# Altium schematic symbol library Maxim Sensors.SchLib: 1171 symbols (part 25 of 44) (continued)
## MAX6658MSA+ (continued)

## MAX6658MSA+T
designator U?
+ / -1 degC, SMBus-Compatible Remote / Local Temperature Sensor with Overtemperature Alarm, 11 Bits Temperature Resolution, -55 to 125 degC, 8-Pin SOIC (S8+5), Pb-Free, Tape and Reel; Generic Part Number: MAX6658; PartNumber: MAX6658MSA+T; Alarm Output: Alert, Overt; Functions: Remote & Local Sensor; Interface: 2-Wire/I2C/SMBus; Multi Droppable: Yes; Parasite Pwr.: No; DatasheetVersion: Rev. 5; PackageVersion: Rev. D, 10/2012; PackageReference: S8+5; PackageDescription: 8-Pin Small-Outline IC, Narrow (0.15in) (S8+5), Body 4.90 x 3.90 mm, Pitch 1.27 mm; Supplier 1: Digi-Key; Supplier Part Number 1: MAX6658MSA+T-ND; Supplier 2: Mouser; Supplier Part Number 2: 700-MAX6658MSAT; Packing: Tape and Reel; Mounting Technology: Surface Mount; Code_JEDEC: MS012; ComponentLink1Description: Manufacturer URL; ComponentLink1URL: http://www.maximintegrated.com/; ComponentLink2Description: Datasheet; ComponentLink2URL: http://datasheets.maximintegrated.com/en/ds/MAX6657-MAX6659.pdf; ComponentLink3Description: Package Specification; ComponentLink3URL: http://pdfserv.maximintegrated.com/package_dwgs/21-0041.PDF
footprint MAXM-S8+5_N (SOIC, 8-Leads, Body 4.90x3.90mm, Pitch 1.27mm, IPC Medium Density)
footprint MAXM-S8+5_L (SOIC, 8-Leads, Body 4.90x3.90mm, Pitch 1.27mm, IPC High Density)
footprint MAXM-S8+5_M (SOIC, 8-Leads, Body 4.90x3.90mm, Pitch 1.27mm, IPC Low Density)
pins: 1 VCC (power) "Supply Voltage Input, +3V to +5.5V. Bypass to GND with a 0.1uF capacitor. A 200ohm series resistor is recommended but not required for additional noise filtering. See Typical Operating Circuit", 2 DXP "Combined Remote-Diode Current Source and A/D Positive Input for Remote-Diode Channel. DO NOT LEAVE DXP UNCONNECTED; connect DXP to DXN if no remote diode is used. Place a 2200pF capacitor between DXP and DXN for noise (See Datasheet)", 3 DXN "Combined Remote-Diode Current Sink and A/D Negative Input. DXN is internally biased to one diode drop above ground.", 4 ~{OVERT1} (oc) "Overtemperature Active-Low Output, Open-Drain. Output is logic low only when temperature is above the software programmed threshold.", 5 GND (power) "Ground", 6 ~{ALERT} (oc) "SMBus Alert (Interrupt) Active-Low Output, Open-Drain. Asserts when temperature exceeds user-set limits (high or low temperature). Stays asserted until acknowledged by either reading the Status register or by successfully (See Datasheet)", 7 SMBDATA (io) "SMBus Serial-Data Input/Output, Open-Drain", 8 SMBCLK (in) "SMBus Serial-Clock Input"

## MAX6658MSA-T
designator U?
+ / -1 degC, SMBus-Compatible Remote / Local Temperature Sensor with Overtemperature Alarm, 11 Bits Temperature Resolution, -55 to 125 degC, 8-Pin SOIC (S8-5), Tape and Reel; Generic Part Number: MAX6658; PartNumber: MAX6658MSA-T; Alarm Output: Alert, Overt; Functions: Remote & Local Sensor; Interface: 2-Wire/I2C/SMBus; Multi Droppable: Yes; Parasite Pwr.: No; DatasheetVersion: Rev. 5; PackageVersion: Rev. D, 10/2012; PackageReference: S8-5; PackageDescription: 8-Pin Small-Outline IC, Narrow (0.15in) (S8-5), Body 4.90 x 3.90 mm, Pitch 1.27 mm; Supplier 1: Mouser; Supplier Part Number 1: N/A; Packing: Tape and Reel; Mounting Technology: Surface Mount; Code_JEDEC: MS012; ComponentLink1Description: Manufacturer URL; ComponentLink1URL: http://www.maximintegrated.com/; ComponentLink2Description: Datasheet; ComponentLink2URL: http://datasheets.maximintegrated.com/en/ds/MAX6657-MAX6659.pdf; ComponentLink3Description: Package Specification; ComponentLink3URL: http://pdfserv.maximintegrated.com/package_dwgs/21-0041.PDF
footprint MAXM-S8-5_N (SOIC, 8-Leads, Body 4.9x3.9mm, Pitch 1.27mm, IPC Medium Density)
footprint MAXM-S8-5_L (SOIC, 8-Leads, Body 4.9x3.9mm, Pitch 1.27mm, IPC High Density)
footprint MAXM-S8-5_M (SOIC, 8-Leads, Body 4.9x3.9mm, Pitch 1.27mm, IPC Low Density)
pins: 1 VCC (power) "Supply Voltage Input, +3V to +5.5V. Bypass to GND with a 0.1uF capacitor. A 200ohm series resistor is recommended but not required for additional noise filtering. See Typical Operating Circuit", 2 DXP "Combined Remote-Diode Current Source and A/D Positive Input for Remote-Diode Channel. DO NOT LEAVE DXP UNCONNECTED; connect DXP to DXN if no remote diode is used. Place a 2200pF capacitor between DXP and DXN for noise (See Datasheet)", 3 DXN "Combined Remote-Diode Current Sink and A/D Negative Input. DXN is internally biased to one diode drop above ground.", 4 ~{OVERT1} (oc) "Overtemperature Active-Low Output, Open-Drain. Output is logic low only when temperature is above the software programmed threshold.", 5 GND (power) "Ground", 6 ~{ALERT} (oc) "SMBus Alert (Interrupt) Active-Low Output, Open-Drain. Asserts when temperature exceeds user-set limits (high or low temperature). Stays asserted until acknowledged by either reading the Status register or by successfully (See Datasheet)", 7 SMBDATA (io) "SMBus Serial-Data Input/Output, Open-Drain", 8 SMBCLK (in) "SMBus Serial-Clock Input"

## MAX6659MEE
designator U?
+ / -1 degC, SMBus-Compatible Remote / Local Temperature Sensor with Overtemperature Alarm, 11 Bits Temperature Resolution, -55 to 125 degC, 16-Pin SOP (E16-5); Generic Part Number: MAX6659; PartNumber: MAX6659MEE; Alarm Output: Alert, Overt; Functions: Remote & Local Sensor; Interface: 2-Wire/I2C/SMBus; Multi Droppable: Yes; Parasite Pwr.: No; DatasheetVersion: Rev. 5; PackageVersion: Rev. K, 04/2012; PackageReference: E16-5; PackageDescription: 16-Pin Quarter Small-Outline Package, Body 3.9 x 4.89 mm, Pitch 0.635 mm; Supplier 1: Mouser; Supplier Part Number 1: N/A; Mounting Technology: Surface Mount; Code_JEDEC: MO-137; ComponentLink1Description: Manufacturer URL; ComponentLink1URL: http://www.maximintegrated.com/; ComponentLink2Description: Datasheet; ComponentLink2URL: http://datasheets.maximintegrated.com/en/ds/MAX6657-MAX6659.pdf; ComponentLink3Description: Package Specification; ComponentLink3URL: http://pdfserv.maximintegrated.com/package_dwgs/21-0055.PDF
footprint MAXM-E16-5_N (SOP, 16-Leads, Body 4.89x3.9mm, Pitch 0.635mm, IPC Medium Density)
footprint MAXM-E16-5_L (SOP, 16-Leads, Body 4.89x3.9mm, Pitch 0.635mm, IPC High Density)
footprint MAXM-E16-5_M (SOP, 16-Leads, Body 4.89x3.9mm, Pitch 0.635mm, IPC Low Density)
part A pins: 1 VCC (power) "Supply Voltage Input, +3V to +5.5V. Bypass to GND with a 0.1uF capacitor. A 200ohm series resistor is recommended but not required for additional noise filtering. See Typical Operating Circuit.", 3 DXP "Combined Remote-Diode Current Source and A/D Positive Input for Remote-Diode Channel. DO NOT LEAVE DXP UNCONNECTED; connect DXP to DXN if no remote diode is used. Place a 2200pF capacitor between DXP and DXN for noise (See Datasheet)", 4 DXN "Combined Remote-Diode Current Sink and A/D Negative Input. DXN is internally biased to one diode drop above ground.", 5 ADD (in) "SMBus Address-Select Pin. The MAX6659 is set to one of three available addresses (connect to VCC, GND, or leave open). See Slave Addresses section.", 6 ~{OVERT1} (oc) "Overtemperature Active-Low Output, Open-Drain. Output is logic low only when temperature is above the software programmed threshold.", 7 GND (power) "Ground", 8 GND (power) "Ground", 9 ~{ALERT} (oc) "SMBus Alert (Interrupt) Active-Low Output, Open-Drain. Asserts when temperature exceeds user-set limits (high or low temperature). Stays asserted until acknowledged by either reading the Status register or by successfully (See Datasheet)", 10 ~{OVERT2} (oc) "Overtemperature Active-Low Output, Open-Drain. Output is logic low only when temperature is above the software programmed threshold.", 12 SMBDATA (io) "SMBus Serial-Data Input/Output, Open-Drain", 14 SMBCLK (in) "SMBus Serial-Clock Input", 15 ~{STBY} (in) "Hardware Standby Input. Temperature and comparison threshold data are retained in standby mode. If S\T\B\Y\ is low, the IC is put into standby mode."
part B pins: 2 NC "Not internally connected. Do not make connections to these pins.", 11 NC "Not internally connected. Do not make connections to these pins.", 13 NC "Not internally connected. Do not make connections to these pins.", 16 NC "Not internally connected. Do not make connections to these pins."

## MAX6659MEE+
designator U?
+ / -1 degC, SMBus-Compatible Remote / Local Temperature Sensor with Overtemperature Alarm, 11 Bits Temperature Resolution, -55 to 125 degC, 16-Pin SOP (E16+5), Pb-Free,; Generic Part Number: MAX6659; PartNumber: MAX6659MEE+; Alarm Output: Alert, Overt; Functions: Remote & Local Sensor; Interface: 2-Wire/I2C/SMBus; Multi Droppable: Yes; Parasite Pwr.: No; DatasheetVersion: Rev. 5; PackageVersion: Rev. K, 04/2012; PackageReference: E16+5; PackageDescription: 16-Pin Quarter Small-Outline Package, Body 3.9 x 4.89 mm, Pitch 0.635 mm; Supplier 1: Digi-Key; Supplier Part Number 1: MAX6659MEE+-ND; Supplier 2: Mouser; Supplier Part Number 2: 700-MAX6659MEE; Mounting Technology: Surface Mount; Code_JEDEC: MO-137; ComponentLink1Description: Manufacturer URL; ComponentLink1URL: http://www.maximintegrated.com/; ComponentLink2Description: Datasheet; ComponentLink2URL: http://datasheets.maximintegrated.com/en/ds/MAX6657-MAX6659.pdf; ComponentLink3Description: Package Specification; ComponentLink3URL: http://pdfserv.maximintegrated.com/package_dwgs/21-0055.PDF
footprint MAXM-E16+5_N (SOP, 16-Leads, Body 4.89x3.9mm, Pitch 0.635mm, IPC Medium Density)
footprint MAXM-E16+5_L (SOP, 16-Leads, Body 4.89x3.9mm, Pitch 0.635mm, IPC High Density)
footprint MAXM-E16+5_M (SOP, 16-Leads, Body 4.89x3.9mm, Pitch 0.635mm, IPC Low Density)
part A pins: 1 VCC (power) "Supply Voltage Input, +3V to +5.5V. Bypass to GND with a 0.1uF capacitor. A 200ohm series resistor is recommended but not required for additional noise filtering. See Typical Operating Circuit.", 3 DXP "Combined Remote-Diode Current Source and A/D Positive Input for Remote-Diode Channel. DO NOT LEAVE DXP UNCONNECTED; connect DXP to DXN if no remote diode is used. Place a 2200pF capacitor between DXP and DXN for noise (See Datasheet)", 4 DXN "Combined Remote-Diode Current Sink and A/D Negative Input. DXN is internally biased to one diode drop above ground.", 5 ADD (in) "SMBus Address-Select Pin. The MAX6659 is set to one of three available addresses (connect to VCC, GND, or leave open). See Slave Addresses section.", 6 ~{OVERT1} (oc) "Overtemperature Active-Low Output, Open-Drain. Output is logic low only when temperature is above the software programmed threshold.", 7 GND (power) "Ground", 8 GND (power) "Ground", 9 ~{ALERT} (oc) "SMBus Alert (Interrupt) Active-Low Output, Open-Drain. Asserts when temperature exceeds user-set limits (high or low temperature). Stays asserted until acknowledged by either reading the Status register or by successfully (See Datasheet)", 10 ~{OVERT2} (oc) "Overtemperature Active-Low Output, Open-Drain. Output is logic low only when temperature is above the software programmed threshold.", 12 SMBDATA (io) "SMBus Serial-Data Input/Output, Open-Drain", 14 SMBCLK (in) "SMBus Serial-Clock Input", 15 ~{STBY} (in) "Hardware Standby Input. Temperature and comparison threshold data are retained in standby mode. If S\T\B\Y\ is low, the IC is put into standby mode."
part B pins: 2 NC "Not internally connected. Do not make connections to these pins.", 11 NC "Not internally connected. Do not make connections to these pins.", 13 NC "Not internally connected. Do not make connections to these pins.", 16 NC "Not internally connected. Do not make connections to these pins."

## MAX6659MEE+T
designator U?
+ / -1 degC, SMBus-Compatible Remote / Local Temperature Sensor with Overtemperature Alarm, 11 Bits Temperature Resolution, -55 to 125 degC, 16-Pin SOP (E16+5), Pb-Free, Tape and Reel; Generic Part Number: MAX6659; PartNumber: MAX6659MEE+T; Alarm Output: Alert, Overt; Functions: Remote & Local Sensor; Interface: 2-Wire/I2C/SMBus; Multi Droppable: Yes; Parasite Pwr.: No; DatasheetVersion: Rev. 5; PackageVersion: Rev. K, 04/2012; PackageReference: E16+5; PackageDescription: 16-Pin Quarter Small-Outline Package, Body 3.9 x 4.89 mm, Pitch 0.635 mm; Supplier 1: Digi-Key; Supplier Part Number 1: MAX6659MEE+T-ND; Supplier 2: Mouser; Supplier Part Number 2: 700-MAX6659MEET; Packing: Tape and Reel; Mounting Technology: Surface Mount; Code_JEDEC: MO-137; ComponentLink1Description: Manufacturer URL; ComponentLink1URL: http://www.maximintegrated.com/; ComponentLink2Description: Datasheet; ComponentLink2URL: http://datasheets.maximintegrated.com/en/ds/MAX6657-MAX6659.pdf; ComponentLink3Description: Package Specification; ComponentLink3URL: http://pdfserv.maximintegrated.com/package_dwgs/21-0055.PDF
footprint MAXM-E16+5_N (SOP, 16-Leads, Body 4.89x3.9mm, Pitch 0.635mm, IPC Medium Density)
footprint MAXM-E16+5_L (SOP, 16-Leads, Body 4.89x3.9mm, Pitch 0.635mm, IPC High Density)
footprint MAXM-E16+5_M (SOP, 16-Leads, Body 4.89x3.9mm, Pitch 0.635mm, IPC Low Density)
part A pins: 1 VCC (power) "Supply Voltage Input, +3V to +5.5V. Bypass to GND with a 0.1uF capacitor. A 200ohm series resistor is recommended but not required for additional noise filtering. See Typical Operating Circuit.", 3 DXP "Combined Remote-Diode Current Source and A/D Positive Input for Remote-Diode Channel. DO NOT LEAVE DXP UNCONNECTED; connect DXP to DXN if no remote diode is used. Place a 2200pF capacitor between DXP and DXN for noise (See Datasheet)", 4 DXN "Combined Remote-Diode Current Sink and A/D Negative Input. DXN is internally biased to one diode drop above ground.", 5 ADD (in) "SMBus Address-Select Pin. The MAX6659 is set to one of three available addresses (connect to VCC, GND, or leave open). See Slave Addresses section.", 6 ~{OVERT1} (oc) "Overtemperature Active-Low Output, Open-Drain. Output is logic low only when temperature is above the software programmed threshold.", 7 GND (power) "Ground", 8 GND (power) "Ground", 9 ~{ALERT} (oc) "SMBus Alert (Interrupt) Active-Low Output, Open-Drain. Asserts when temperature exceeds user-set limits (high or low temperature). Stays asserted until acknowledged by either reading the Status register or by successfully (See Datasheet)", 10 ~{OVERT2} (oc) "Overtemperature Active-Low Output, Open-Drain. Output is logic low only when temperature is above the software programmed threshold.", 12 SMBDATA (io) "SMBus Serial-Data Input/Output, Open-Drain", 14 SMBCLK (in) "SMBus Serial-Clock Input", 15 ~{STBY} (in) "Hardware Standby Input. Temperature and comparison threshold data are retained in standby mode. If S\T\B\Y\ is low, the IC is put into standby mode."
part B pins: 2 NC "Not internally connected. Do not make connections to these pins.", 11 NC "Not internally connected. Do not make connections to these pins.", 13 NC "Not internally connected. Do not make connections to these pins.", 16 NC "Not internally connected. Do not make connections to these pins."

## MAX6659MEE-T
designator U?
+ / -1 degC, SMBus-Compatible Remote / Local Temperature Sensor with Overtemperature Alarm, 11 Bits Temperature Resolution, -55 to 125 degC, 16-Pin SOP (E16-5), Tape and Reel; Generic Part Number: MAX6659; PartNumber: MAX6659MEE-T; Alarm Output: Alert, Overt; Functions: Remote & Local Sensor; Interface: 2-Wire/I2C/SMBus; Multi Droppable: Yes; Parasite Pwr.: No; DatasheetVersion: Rev. 5; PackageVersion: Rev. K, 04/2012; PackageReference: E16-5; PackageDescription: 16-Pin Quarter Small-Outline Package, Body 3.9 x 4.89 mm, Pitch 0.635 mm; Supplier 1: Mouser; Supplier Part Number 1: N/A; Packing: Tape and Reel; Mounting Technology: Surface Mount; Code_JEDEC: MO-137; ComponentLink1Description: Manufacturer URL; ComponentLink1URL: http://www.maximintegrated.com/; ComponentLink2Description: Datasheet; ComponentLink2URL: http://datasheets.maximintegrated.com/en/ds/MAX6657-MAX6659.pdf; ComponentLink3Description: Package Specification; ComponentLink3URL: http://pdfserv.maximintegrated.com/package_dwgs/21-0055.PDF
footprint MAXM-E16-5_N (SOP, 16-Leads, Body 4.89x3.9mm, Pitch 0.635mm, IPC Medium Density)
footprint MAXM-E16-5_L (SOP, 16-Leads, Body 4.89x3.9mm, Pitch 0.635mm, IPC High Density)
footprint MAXM-E16-5_M (SOP, 16-Leads, Body 4.89x3.9mm, Pitch 0.635mm, IPC Low Density)
part A pins: 1 VCC (power) "Supply Voltage Input, +3V to +5.5V. Bypass to GND with a 0.1uF capacitor. A 200ohm series resistor is recommended but not required for additional noise filtering. See Typical Operating Circuit.", 3 DXP "Combined Remote-Diode Current Source and A/D Positive Input for Remote-Diode Channel. DO NOT LEAVE DXP UNCONNECTED; connect DXP to DXN if no remote diode is used. Place a 2200pF capacitor between DXP and DXN for noise (See Datasheet)", 4 DXN "Combined Remote-Diode Current Sink and A/D Negative Input. DXN is internally biased to one diode drop above ground.", 5 ADD (in) "SMBus Address-Select Pin. The MAX6659 is set to one of three available addresses (connect to VCC, GND, or leave open). See Slave Addresses section.", 6 ~{OVERT1} (oc) "Overtemperature Active-Low Output, Open-Drain. Output is logic low only when temperature is above the software programmed threshold.", 7 GND (power) "Ground", 8 GND (power) "Ground", 9 ~{ALERT} (oc) "SMBus Alert (Interrupt) Active-Low Output, Open-Drain. Asserts when temperature exceeds user-set limits (high or low temperature). Stays asserted until acknowledged by either reading the Status register or by successfully (See Datasheet)", 10 ~{OVERT2} (oc) "Overtemperature Active-Low Output, Open-Drain. Output is logic low only when temperature is above the software programmed threshold.", 12 SMBDATA (io) "SMBus Serial-Data Input/Output, Open-Drain", 14 SMBCLK (in) "SMBus Serial-Clock Input", 15 ~{STBY} (in) "Hardware Standby Input. Temperature and comparison threshold data are retained in standby mode. If S\T\B\Y\ is low, the IC is put into standby mode."
part B pins: 2 NC "Not internally connected. Do not make connections to these pins.", 11 NC "Not internally connected. Do not make connections to these pins.", 13 NC "Not internally connected. Do not make connections to these pins.", 16 NC "Not internally connected. Do not make connections to these pins."

## MAX6660AEE
designator U?
Fan-Speed Regulator and Monitor with I2C / SMBus Interface, -40 to 125 degC, 16-Pin SOP (E16-5); Generic Part Number: MAX6660; PartNumber: MAX6660AEE; Fan Cntrl.: Linear; Interface: 2-Wire/I2C/SMBus; DatasheetVersion: Rev. 1; PackageVersion: Rev. K, 04/2012; PackageReference: E16-5; PackageDescription: 16-Pin Quarter Small-Outline Package, Body 3.9 x 4.89 mm, Pitch 0.635 mm; Supplier 1: Mouser; Supplier Part Number 1: N/A; Mounting Technology: Surface Mount; Code_JEDEC: MO-137; ComponentLink1Description: Manufacturer URL; ComponentLink1URL: http://www.maximintegrated.com/; ComponentLink2Description: Datasheet; ComponentLink2URL: http://datasheets.maximintegrated.com/en/ds/MAX6660.pdf; ComponentLink3Description: Package Specification; ComponentLink3URL: http://pdfserv.maximintegrated.com/package_dwgs/21-0055.PDF
footprint MAXM-E16-5_N (SOP, 16-Leads, Body 4.89x3.9mm, Pitch 0.635mm, IPC Medium Density)
footprint MAXM-E16-5_L (SOP, 16-Leads, Body 4.89x3.9mm, Pitch 0.635mm, IPC High Density)
footprint MAXM-E16-5_M (SOP, 16-Leads, Body 4.89x3.9mm, Pitch 0.635mm, IPC Low Density)
pins: 1 VFAN (power) "Fan Drive Power-Supply Input. 4.5V to 13.5V.", 2 VCC (power) "Supply Voltage Input. +3V to +5.5V. Bypass VCC to ground with a 0.1uF capacitor.", 3 DXP "Input: Remote-Junction Anode. Place a 2200pF capacitor between DXP and DXN for noise filtering.", 4 DXN "Input: Remote-Junction Cathode. DXN is internally biased to a diode voltage above ground.", 5 FAN (oc) "Open-Drain Output to Fan Low Side. Connect a minimum 1uF capacitor between FAN and VFAN.", 6 ADD1 (in) "SMBus Address Select Pin. ADD0 and ADD1 are sampled upon power-up.", 7 PGND (power) "Power Ground", 8 AGND (power) "Analog Ground", 9 ~{OVERT} (oc) "Overtemperature Shutdown Output. Active-low output (programmable for active high if desired). Open drain.", 10 ADD0 (in) "SMBus Slave Address Select Pin. ADD0 and ADD1 are sampled upon power-up.", 11 ~{ALERT} (oc) "SMBus Alert (Interrupt) Output. Open-drain, active-low output.", 12 SMBDATA (io) "SMBus Serial Data Input/Output. Open drain.", 13 GAIN (in) "Gain Control. Connect an external resistor from GAIN to VCC to reduce the gain of the current-sense mode.", 14 SMBCLK (in) "SMBus Clock Line from Controller. This line tolerates inputs up to VCC even if MAX6660 is not powered.", 15 ~{STBY} (in) "Hardware Standby Input. Drive S\T\B\Y\ low to reduce supply current. Temperature and comparison data are retained in standby mode.", 16 TACH IN (in) "Fan Tachometer Input. Tolerates voltages up to VFAN."

## MAX6660AEE+
designator U?
Fan-Speed Regulator and Monitor with I2C / SMBus Interface, -40 to 125 degC, 16-Pin SOP (E16+5), Pb-Free; Generic Part Number: MAX6660; PartNumber: MAX6660AEE+; Fan Cntrl.: Linear; Interface: 2-Wire/I2C/SMBus; DatasheetVersion: Rev. 1; PackageVersion: Rev. K, 04/2012; PackageReference: E16+5; PackageDescription: 16-Pin Quarter Small-Outline Package, Body 3.9 x 4.89 mm, Pitch 0.635 mm; Supplier 1: Digi-Key; Supplier Part Number 1: MAX6660AEE+-ND; Supplier 2: Mouser; Supplier Part Number 2: 700-MAX6660AEE; Mounting Technology: Surface Mount; Code_JEDEC: MO-137; ComponentLink1Description: Manufacturer URL; ComponentLink1URL: http://www.maximintegrated.com/; ComponentLink2Description: Datasheet; ComponentLink2URL: http://datasheets.maximintegrated.com/en/ds/MAX6660.pdf; ComponentLink3Description: Package Specification; ComponentLink3URL: http://pdfserv.maximintegrated.com/package_dwgs/21-0055.PDF
footprint MAXM-E16+5_N (SOP, 16-Leads, Body 4.89x3.9mm, Pitch 0.635mm, IPC Medium Density)
footprint MAXM-E16+5_L (SOP, 16-Leads, Body 4.89x3.9mm, Pitch 0.635mm, IPC High Density)
footprint MAXM-E16+5_M (SOP, 16-Leads, Body 4.89x3.9mm, Pitch 0.635mm, IPC Low Density)
pins: 1 VFAN (power) "Fan Drive Power-Supply Input. 4.5V to 13.5V.", 2 VCC (power) "Supply Voltage Input. +3V to +5.5V. Bypass VCC to ground with a 0.1uF capacitor.", 3 DXP "Input: Remote-Junction Anode. Place a 2200pF capacitor between DXP and DXN for noise filtering.", 4 DXN "Input: Remote-Junction Cathode. DXN is internally biased to a diode voltage above ground.", 5 FAN (oc) "Open-Drain Output to Fan Low Side. Connect a minimum 1uF capacitor between FAN and VFAN.", 6 ADD1 (in) "SMBus Address Select Pin. ADD0 and ADD1 are sampled upon power-up.", 7 PGND (power) "Power Ground", 8 AGND (power) "Analog Ground", 9 ~{OVERT} (oc) "Overtemperature Shutdown Output. Active-low output (programmable for active high if desired). Open drain.", 10 ADD0 (in) "SMBus Slave Address Select Pin. ADD0 and ADD1 are sampled upon power-up.", 11 ~{ALERT} (oc) "SMBus Alert (Interrupt) Output. Open-drain, active-low output.", 12 SMBDATA (io) "SMBus Serial Data Input/Output. Open drain.", 13 GAIN (in) "Gain Control. Connect an external resistor from GAIN to VCC to reduce the gain of the current-sense mode.", 14 SMBCLK (in) "SMBus Clock Line from Controller. This line tolerates inputs up to VCC even if MAX6660 is not powered.", 15 ~{STBY} (in) "Hardware Standby Input. Drive S\T\B\Y\ low to reduce supply current. Temperature and comparison data are retained in standby mode.", 16 TACH IN (in) "Fan Tachometer Input. Tolerates voltages up to VFAN."

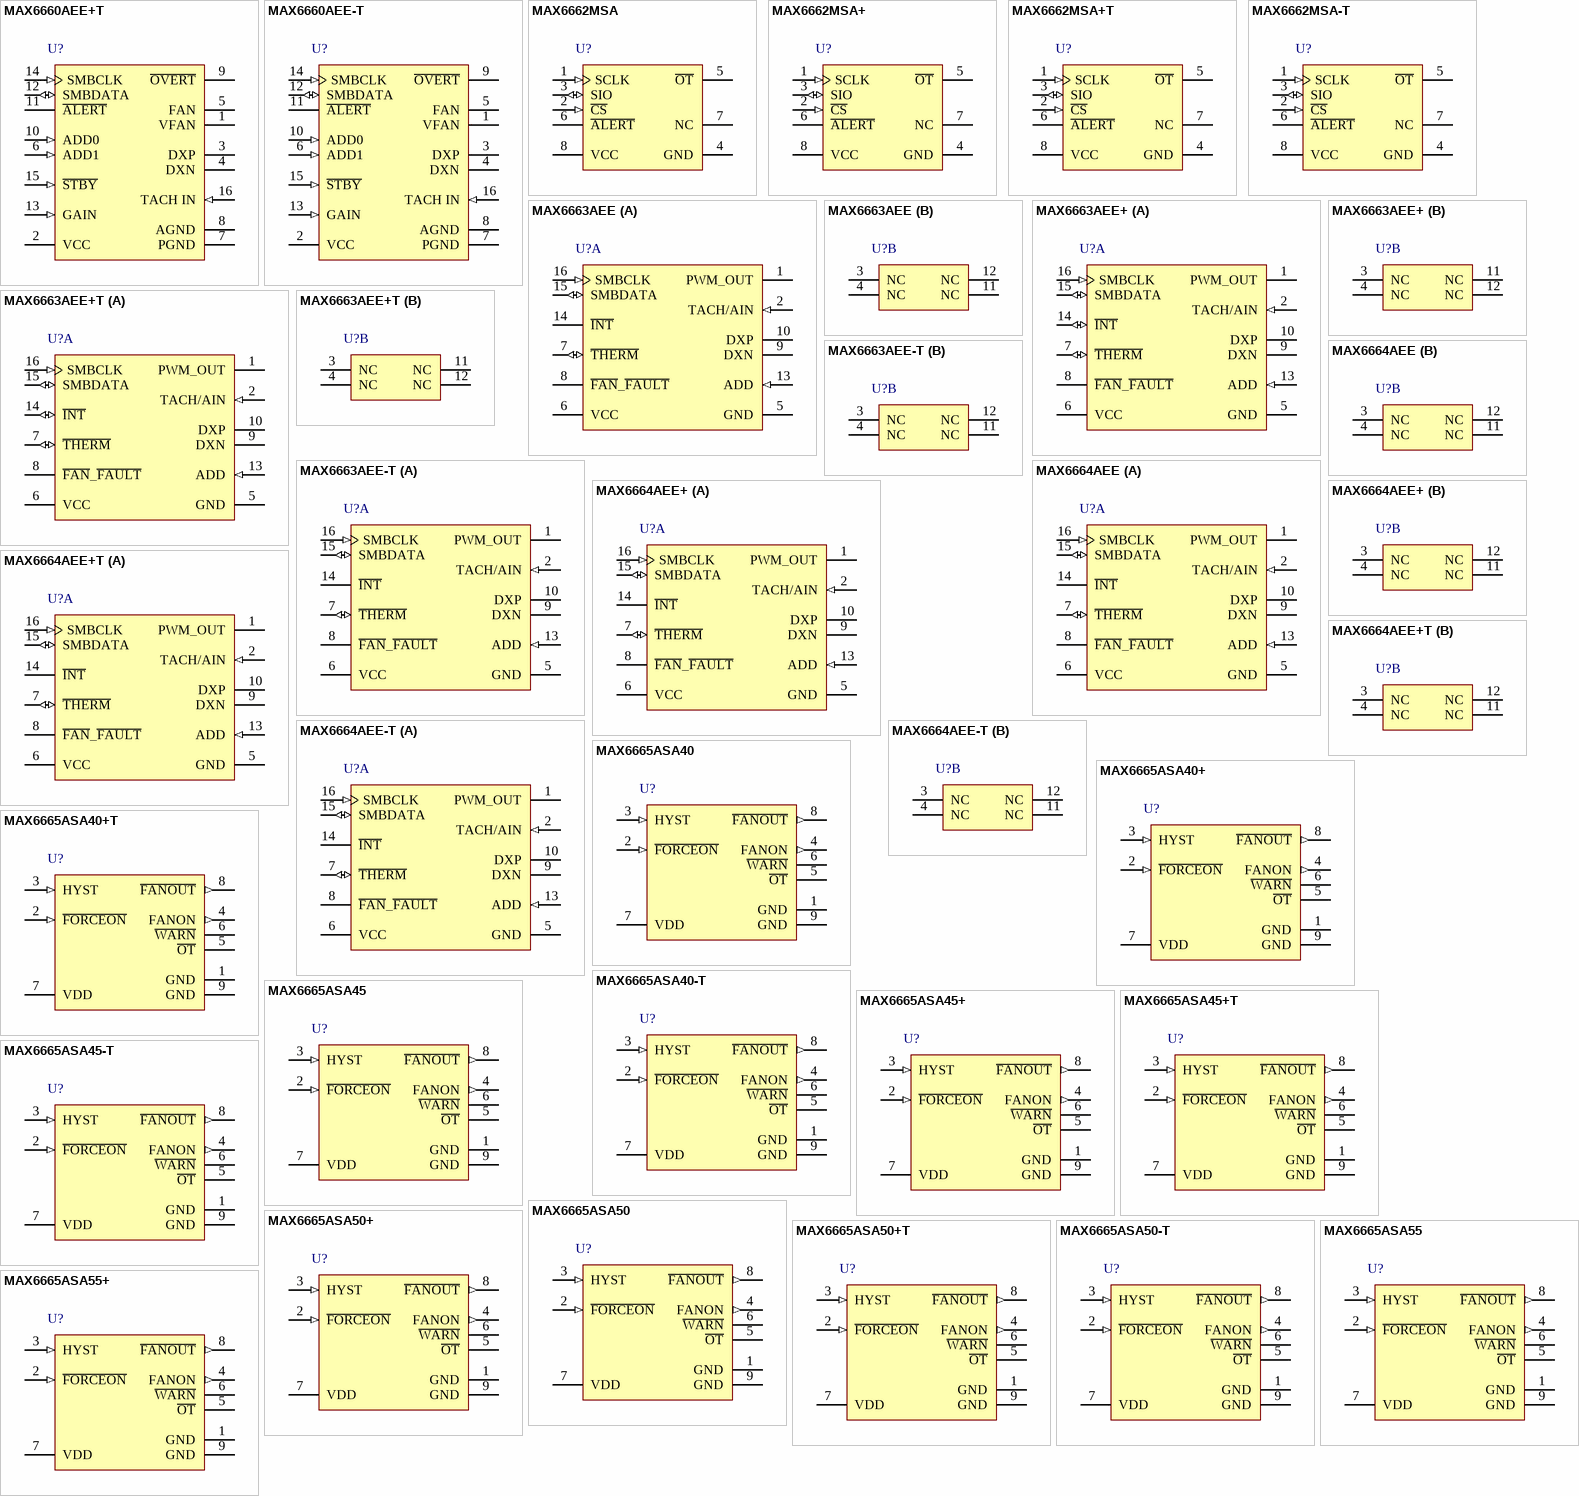
[diagram p21: symbols MAX6660AEE+T to MAX6665ASA55+]

## MAX6660AEE+T
designator U?
Fan-Speed Regulator and Monitor with I2C / SMBus Interface, -40 to 125 degC, 16-Pin SOP (E16+5), Pb-Free, Tape and Reel; Generic Part Number: MAX6660; PartNumber: MAX6660AEE+T; Fan Cntrl.: Linear; Interface: 2-Wire/I2C/SMBus; DatasheetVersion: Rev. 1; PackageVersion: Rev. K, 04/2012; PackageReference: E16+5; PackageDescription: 16-Pin Quarter Small-Outline Package, Body 3.9 x 4.89 mm, Pitch 0.635 mm; Supplier 1: Digi-Key; Supplier Part Number 1: MAX6660AEE+T-ND; Supplier 2: Mouser; Supplier Part Number 2: 700-MAX6660AEET; Packing: Tape and Reel; Mounting Technology: Surface Mount; Code_JEDEC: MO-137; ComponentLink1Description: Manufacturer URL; ComponentLink1URL: http://www.maximintegrated.com/; ComponentLink2Description: Datasheet; ComponentLink2URL: http://datasheets.maximintegrated.com/en/ds/MAX6660.pdf; ComponentLink3Description: Package Specification; ComponentLink3URL: http://pdfserv.maximintegrated.com/package_dwgs/21-0055.PDF
footprint MAXM-E16+5_N (SOP, 16-Leads, Body 4.89x3.9mm, Pitch 0.635mm, IPC Medium Density)
footprint MAXM-E16+5_L (SOP, 16-Leads, Body 4.89x3.9mm, Pitch 0.635mm, IPC High Density)
footprint MAXM-E16+5_M (SOP, 16-Leads, Body 4.89x3.9mm, Pitch 0.635mm, IPC Low Density)
pins: 1 VFAN (power) "Fan Drive Power-Supply Input. 4.5V to 13.5V.", 2 VCC (power) "Supply Voltage Input. +3V to +5.5V. Bypass VCC to ground with a 0.1uF capacitor.", 3 DXP "Input: Remote-Junction Anode. Place a 2200pF capacitor between DXP and DXN for noise filtering.", 4 DXN "Input: Remote-Junction Cathode. DXN is internally biased to a diode voltage above ground.", 5 FAN (oc) "Open-Drain Output to Fan Low Side. Connect a minimum 1uF capacitor between FAN and VFAN.", 6 ADD1 (in) "SMBus Address Select Pin. ADD0 and ADD1 are sampled upon power-up.", 7 PGND (power) "Power Ground", 8 AGND (power) "Analog Ground", 9 ~{OVERT} (oc) "Overtemperature Shutdown Output. Active-low output (programmable for active high if desired). Open drain.", 10 ADD0 (in) "SMBus Slave Address Select Pin. ADD0 and ADD1 are sampled upon power-up.", 11 ~{ALERT} (oc) "SMBus Alert (Interrupt) Output. Open-drain, active-low output.", 12 SMBDATA (io) "SMBus Serial Data Input/Output. Open drain.", 13 GAIN (in) "Gain Control. Connect an external resistor from GAIN to VCC to reduce the gain of the current-sense mode.", 14 SMBCLK (in) "SMBus Clock Line from Controller. This line tolerates inputs up to VCC even if MAX6660 is not powered.", 15 ~{STBY} (in) "Hardware Standby Input. Drive S\T\B\Y\ low to reduce supply current. Temperature and comparison data are retained in standby mode.", 16 TACH IN (in) "Fan Tachometer Input. Tolerates voltages up to VFAN."

## MAX6660AEE-T
designator U?
Fan-Speed Regulator and Monitor with I2C / SMBus Interface, -40 to 125 degC, 16-Pin SOP (E16-5), Tape and Reel; Generic Part Number: MAX6660; PartNumber: MAX6660AEE-T; Fan Cntrl.: Linear; Interface: 2-Wire/I2C/SMBus; DatasheetVersion: Rev. 1; PackageVersion: Rev. K, 04/2012; PackageReference: E16-5; PackageDescription: 16-Pin Quarter Small-Outline Package, Body 3.9 x 4.89 mm, Pitch 0.635 mm; Supplier 1: Mouser; Supplier Part Number 1: N/A; Packing: Tape and Reel; Mounting Technology: Surface Mount; Code_JEDEC: MO-137; ComponentLink1Description: Manufacturer URL; ComponentLink1URL: http://www.maximintegrated.com/; ComponentLink2Description: Datasheet; ComponentLink2URL: http://datasheets.maximintegrated.com/en/ds/MAX6660.pdf; ComponentLink3Description: Package Specification; ComponentLink3URL: http://pdfserv.maximintegrated.com/package_dwgs/21-0055.PDF
footprint MAXM-E16-5_N (SOP, 16-Leads, Body 4.89x3.9mm, Pitch 0.635mm, IPC Medium Density)
footprint MAXM-E16-5_L (SOP, 16-Leads, Body 4.89x3.9mm, Pitch 0.635mm, IPC High Density)
footprint MAXM-E16-5_M (SOP, 16-Leads, Body 4.89x3.9mm, Pitch 0.635mm, IPC Low Density)
pins: 1 VFAN (power) "Fan Drive Power-Supply Input. 4.5V to 13.5V.", 2 VCC (power) "Supply Voltage Input. +3V to +5.5V. Bypass VCC to ground with a 0.1uF capacitor.", 3 DXP "Input: Remote-Junction Anode. Place a 2200pF capacitor between DXP and DXN for noise filtering.", 4 DXN "Input: Remote-Junction Cathode. DXN is internally biased to a diode voltage above ground.", 5 FAN (oc) "Open-Drain Output to Fan Low Side. Connect a minimum 1uF capacitor between FAN and VFAN.", 6 ADD1 (in) "SMBus Address Select Pin. ADD0 and ADD1 are sampled upon power-up.", 7 PGND (power) "Power Ground", 8 AGND (power) "Analog Ground", 9 ~{OVERT} (oc) "Overtemperature Shutdown Output. Active-low output (programmable for active high if desired). Open drain.", 10 ADD0 (in) "SMBus Slave Address Select Pin. ADD0 and ADD1 are sampled upon power-up.", 11 ~{ALERT} (oc) "SMBus Alert (Interrupt) Output. Open-drain, active-low output.", 12 SMBDATA (io) "SMBus Serial Data Input/Output. Open drain.", 13 GAIN (in) "Gain Control. Connect an external resistor from GAIN to VCC to reduce the gain of the current-sense mode.", 14 SMBCLK (in) "SMBus Clock Line from Controller. This line tolerates inputs up to VCC even if MAX6660 is not powered.", 15 ~{STBY} (in) "Hardware Standby Input. Drive S\T\B\Y\ low to reduce supply current. Temperature and comparison data are retained in standby mode.", 16 TACH IN (in) "Fan Tachometer Input. Tolerates voltages up to VFAN."

## MAX6662MSA
designator U?
12-Bit Plus Sign Temperature Sensor with SPI-Compatible Serial Interface, 13 Bits Temperature Resolution, -55 to 150 degC, 8-Pin SOIC (S8-2); Generic Part Number: MAX6662; PartNumber: MAX6662MSA; Alarm Output: Alert, Overt; Interface: 3-Wire/SPI; Parasite Pwr.: No; DatasheetVersion: Rev. 0; PackageVersion: Rev. D, 10/2012; PackageReference: S8-2; PackageDescription: 8-Pin Small-Outline IC, Narrow (0.15in) (S8-2), Body 4.90 x 3.90 mm, Pitch 1.27 mm; Supplier 1: Mouser; Supplier Part Number 1: N/A; Mounting Technology: Surface Mount; Code_JEDEC: MS012; ComponentLink1Description: Manufacturer URL; ComponentLink1URL: http://www.maximintegrated.com/; ComponentLink2Description: Datasheet; ComponentLink2URL: http://datasheets.maximintegrated.com/en/ds/MAX6662.pdf; ComponentLink3Description: Package Specification; ComponentLink3URL: http://pdfserv.maximintegrated.com/package_dwgs/21-0041.PDF
footprint MAXM-S8-2_N (SOIC, 8-Leads, Body 4.90x3.90mm, Pitch 1.27mm, IPC Medium Density)
footprint MAXM-S8-2_L (SOIC, 8-Leads, Body 4.90x3.90mm, Pitch 1.27mm, IPC High Density)
footprint MAXM-S8-2_M (SOIC, 8-Leads, Body 4.90x3.90mm, Pitch 1.27mm, IPC Low Density)
pins: 1 SCLK (in) "Serial-Clock Input", 2 ~{CS} (in) "Chip Select Input. Set low to enable the serial interface for data input/output.", 3 SIO (io) "Serial-Data Input/Output. Bidirectional data input and output for serial interface.", 4 GND (power) "Ground", 5 ~{OT} (oc) "Overtemperature Output. Open-drain output requires a pullup resistor to VCC.", 6 ~{ALERT} (oc) "Alert Output. Open-drain output requires a pullup resistor to VCC.", 7 NC "No Connection. Do not make a connection to this pin.", 8 VCC (power) "Supply Voltage Input. Bypass to GND with a 0.1μF capacitor as close to VCC as possible."

## MAX6662MSA+
designator U?
12-Bit Plus Sign Temperature Sensor with SPI-Compatible Serial Interface, 13 Bits Temperature Resolution, -55 to 150 degC, 8-Pin SOIC (S8+2), Pb-Free; Generic Part Number: MAX6662; PartNumber: MAX6662MSA+; Alarm Output: Alert, Overt; Interface: 3-Wire/SPI; Parasite Pwr.: No; DatasheetVersion: Rev. 0; PackageVersion: Rev. D, 10/2012; PackageReference: S8+2; PackageDescription: 8-Pin Small-Outline IC, Narrow (0.15in) (S8+2), Body 4.90 x 3.90 mm, Pitch 1.27 mm; Supplier 1: Digi-Key; Supplier Part Number 1: MAX6662MSA+-ND; Supplier 2: Mouser; Supplier Part Number 2: 700-MAX6662MSA; Mounting Technology: Surface Mount; Code_JEDEC: MS012; ComponentLink1Description: Manufacturer URL; ComponentLink1URL: http://www.maximintegrated.com/; ComponentLink2Description: Datasheet; ComponentLink2URL: http://datasheets.maximintegrated.com/en/ds/MAX6662.pdf; ComponentLink3Description: Package Specification; ComponentLink3URL: http://pdfserv.maximintegrated.com/package_dwgs/21-0041.PDF
footprint MAXM-S8+2_N (SOIC, 8-Leads, Body 4.90x3.90mm, Pitch 1.27mm, IPC Medium Density)
footprint MAXM-S8+2_L (SOIC, 8-Leads, Body 4.90x3.90mm, Pitch 1.27mm, IPC High Density)
footprint MAXM-S8+2_M (SOIC, 8-Leads, Body 4.90x3.90mm, Pitch 1.27mm, IPC Low Density)
pins: 1 SCLK (in) "Serial-Clock Input", 2 ~{CS} (in) "Chip Select Input. Set low to enable the serial interface for data input/output.", 3 SIO (io) "Serial-Data Input/Output. Bidirectional data input and output for serial interface.", 4 GND (power) "Ground", 5 ~{OT} (oc) "Overtemperature Output. Open-drain output requires a pullup resistor to VCC.", 6 ~{ALERT} (oc) "Alert Output. Open-drain output requires a pullup resistor to VCC.", 7 NC "No Connection. Do not make a connection to this pin.", 8 VCC (power) "Supply Voltage Input. Bypass to GND with a 0.1μF capacitor as close to VCC as possible."